# Altium footprint library SAMTEC THD.PcbLib: 161 footprints (part 6 of 12) (continued)
## SAMTEC_SSW-105-01-G-D [mm] "10 Contacts - Pitch 2.54mm - Double Row Through Mount Straight Socket (Lead Length 2.64mm)"
height 8.51
pads (10):
  round 1.7 hole 1: 1(-5.08,1.27) 2(-5.08,-1.27) 3(-2.54,1.27) 4(-2.54,-1.27) 5(0,1.27) 6(0,-1.27) 7(2.54,1.27) 8(2.54,-1.27) 9(5.08,1.27) 10(5.08,-1.27)
Top Overlay:
  circle w0.3: c-5.115,3.135 r0.15
  lines w0.2: -6.604,-2.477 6.604,-2.477 6.604,2.477 -6.604,2.477 -6.604,-2.477
  text "1" at -7.427,0.772 h1.2
  text "10" at 7.15,-1.85 h1.2
Mechanical 8:
  lines w0.1: -5.58,-1.27 -5.08,-1.27 ; -5.58,1.27 -5.08,1.27 ; -5.08,-1.77 -5.08,-1.27 ; -5.08,-0.77 -5.08,-1.27 ; -5.08,0.77 -5.08,1.27 ; -5.08,1.77 -5.08,1.27 ; -4.58,-1.27 -5.08,-1.27 ; -4.58,1.27 -5.08,1.27 ; -3.04,-1.27 -2.54,-1.27 ; -3.04,1.27 -2.54,1.27 ; -2.54,-1.77 -2.54,-1.27 ; -2.54,-0.77 -2.54,-1.27 ; -2.54,0.77 -2.54,1.27 ; -2.54,1.77 -2.54,1.27 ; -2.04,-1.27 -2.54,-1.27 ; -2.04,1.27 -2.54,1.27 ; -0.5,-1.27 0,-1.27 ; -0.5,0 0,0 ; -0.5,1.27 0,1.27 ; 0,-1.77 0,-1.27 ; 0,-0.77 0,-1.27 ; 0,-0.5 0,0 ; 0,0.5 0,0 ; 0,0.77 0,1.27 ; 0,1.77 0,1.27 ; 0.5,-1.27 0,-1.27 ; 0.5,0 0,0 ; 0.5,1.27 0,1.27 ; 2.04,-1.27 2.54,-1.27 ; 2.04,1.27 2.54,1.27 ; 2.54,-1.77 2.54,-1.27 ; 2.54,-0.77 2.54,-1.27 ; 2.54,0.77 2.54,1.27 ; 2.54,1.77 2.54,1.27 ; 3.04,-1.27 2.54,-1.27 ; 3.04,1.27 2.54,1.27 ; 4.58,-1.27 5.08,-1.27 ; 4.58,1.27 5.08,1.27 ; 5.08,-1.77 5.08,-1.27 ; 5.08,-0.77 5.08,-1.27 ; 5.08,0.77 5.08,1.27 ; 5.08,1.77 5.08,1.27 ; 5.58,-1.27 5.08,-1.27 ; 5.58,1.27 5.08,1.27
Mechanical 14:
  circle w0.3: c-5.115,3.135 r0.15
  lines w0.1: -6.604,-2.477 6.604,-2.477 6.604,2.35 6.731,2.477 -6.604,2.477 -6.604,-2.477 ; -5.906,-2.095 -5.906,-0.445 -4.255,-0.445 -4.255,-2.095 -5.906,-2.095 ; -5.906,0.445 -5.906,2.095 -4.255,2.095 -4.255,0.445 -5.906,0.445 ; -5.474,-1.664 -5.474,-0.876 -4.686,-0.876 -4.686,-1.664 -5.474,-1.664 ; -5.474,0.876 -5.474,1.664 -4.686,1.664 -4.686,0.876 -5.474,0.876 ; -3.366,-2.095 -3.366,-0.445 -1.715,-0.445 -1.715,-2.095 -3.366,-2.095 ; -3.366,0.445 -3.366,2.095 -1.715,2.095 -1.715,0.445 -3.366,0.445 ; -2.934,-1.664 -2.934,-0.876 -2.146,-0.876 -2.146,-1.664 -2.934,-1.664 ; -2.934,0.876 -2.934,1.664 -2.146,1.664 -2.146,0.876 -2.934,0.876 ; -0.826,-2.095 -0.826,-0.445 0.825,-0.445 0.825,-2.095 -0.826,-2.095 ; -0.826,0.445 -0.826,2.095 0.825,2.095 0.825,0.445 -0.826,0.445 ; -0.394,-1.664 -0.394,-0.876 0.394,-0.876 0.394,-1.664 -0.394,-1.664 ; -0.394,0.876 -0.394,1.664 0.394,1.664 0.394,0.876 -0.394,0.876 ; 1.714,-2.095 1.714,-0.445 3.365,-0.445 3.365,-2.095 1.714,-2.095 ; 1.714,0.445 1.714,2.095 3.365,2.095 3.365,0.445 1.714,0.445 ; 2.146,-1.664 2.146,-0.876 2.934,-0.876 2.934,-1.664 2.146,-1.664 ; 2.146,0.876 2.146,1.664 2.934,1.664 2.934,0.876 2.146,0.876 ; 4.255,-2.095 4.255,-0.445 5.905,-0.445 5.905,-2.095 4.255,-2.095 ; 4.255,0.445 4.255,2.095 5.905,2.095 5.905,0.445 4.255,0.445 ; 4.686,-1.664 4.686,-0.876 5.474,-0.876 5.474,-1.664 4.686,-1.664 ; 4.686,0.876 4.686,1.664 5.474,1.664 5.474,0.876 4.686,0.876
  text "1" at -7.427,0.772 h1.2
  text "10" at 7.15,-1.85 h1.2
3D body "SAMTEC_SSW-105-01-G-D.stp": height 8.51, standoff -2.64, extent -6.604,-2.476 6.604,2.477

## SAMTEC_SSW-106-02-L-D-RA [mm] "12 Contacts, Pitch 2.54mm - Dual Row, Through Mount Right Angle Socket"
height 4.95
pads (12):
  rect 1.8x1.8 hole 1.1: 1(6.35,-1.27)
  round 1.8 hole 1.1: 2(6.35,1.27) 3(3.81,-1.27) 4(3.81,1.27) 5(1.27,-1.27) 6(1.27,1.27) 7(-1.27,-1.27) 8(-1.27,1.27) 9(-3.81,-1.27) 10(-3.81,1.27) 11(-6.35,-1.27) 12(-6.35,1.27)
Top Overlay:
  circle w0.3: c7.979,-1.3 r0.15
  lines w0.2: -6.744,2.67 -6.744,3.302 ; -5.956,2.67 -5.956,3.302 ; -4.204,2.67 -4.204,3.302 ; -3.416,2.67 -3.416,3.302 ; -1.664,2.67 -1.664,3.302 ; -0.876,2.67 -0.876,3.302 ; 0.876,2.67 0.876,3.302 ; 1.664,2.67 1.664,3.302 ; 3.416,2.67 3.416,3.302 ; 4.204,2.67 4.204,3.302 ; 5.956,2.67 5.956,3.302 ; 6.744,2.67 6.744,3.302 ; -7.874,2.794 -7.874,11.303 7.874,11.303 7.874,2.794 7.366,2.794 7.366,3.302 5.334,3.302 5.334,2.794 4.826,2.794 4.826,3.302 2.794,3.302 2.794,2.794 2.286,2.794 2.286,3.302 0.254,3.302 0.254,2.794 -0.254,2.794 -0.254,3.302 -2.286,3.302 -2.286,2.794 -2.794,2.794 -2.794,3.302 -4.826,3.302 -4.826,2.794 -5.334,2.794 -5.334,3.302 -7.366,3.302 -7.366,2.794 -7.874,2.794
Mechanical 8:
  circle w0.1: c-6.35,1.27 r0.6
  circle w0.1: c-6.35,1.27 r0.95
  lines w0.1: -6.85,-1.27 -6.35,-1.27 ; -6.85,1.27 -6.35,1.27 ; -6.35,-1.77 -6.35,-1.27 ; -6.35,-0.77 -6.35,-1.27 ; -6.35,0.77 -6.35,1.27 ; -6.35,1.77 -6.35,1.27 ; -5.85,-1.27 -6.35,-1.27 ; -5.85,1.27 -6.35,1.27 ; -4.31,-1.27 -3.81,-1.27 ; -4.31,1.27 -3.81,1.27 ; -3.81,-1.77 -3.81,-1.27 ; -3.81,-0.77 -3.81,-1.27 ; -3.81,0.77 -3.81,1.27 ; -3.81,1.77 -3.81,1.27 ; -3.31,-1.27 -3.81,-1.27 ; -3.31,1.27 -3.81,1.27 ; -1.77,-1.27 -1.27,-1.27 ; -1.77,1.27 -1.27,1.27 ; -1.27,-1.77 -1.27,-1.27 ; -1.27,-0.77 -1.27,-1.27 ; -1.27,0.77 -1.27,1.27 ; -1.27,1.77 -1.27,1.27 ; -0.77,-1.27 -1.27,-1.27 ; -0.77,1.27 -1.27,1.27 ; -0.5,0 0,0 ; 0,-0.5 0,0 ; 0,0.5 0,0 ; 0.5,0 0,0 ; 0.77,-1.27 1.27,-1.27 ; 0.77,1.27 1.27,1.27 ; 1.27,-1.77 1.27,-1.27 ; 1.27,-0.77 1.27,-1.27 ; 1.27,0.77 1.27,1.27 ; 1.27,1.77 1.27,1.27 ; 1.77,-1.27 1.27,-1.27 ; 1.77,1.27 1.27,1.27 ; 3.31,-1.27 3.81,-1.27 ; 3.31,1.27 3.81,1.27 ; 3.81,-1.77 3.81,-1.27 ; 3.81,-0.77 3.81,-1.27 ; 3.81,0.77 3.81,1.27 ; 3.81,1.77 3.81,1.27 ; 4.31,-1.27 3.81,-1.27 ; 4.31,1.27 3.81,1.27 ; 5.85,-1.27 6.35,-1.27 ; 5.85,1.27 6.35,1.27 ; 6.35,-1.77 6.35,-1.27 ; 6.35,-0.77 6.35,-1.27 ; 6.35,0.77 6.35,1.27 ; 6.35,1.77 6.35,1.27 ; 6.85,-1.27 6.35,-1.27 ; 6.85,1.27 6.35,1.27
Mechanical 14:
  circle w0.3: c7.979,-1.3 r0.15
  lines w0.1: -6.744,3.302 -6.744,-1.473 -5.956,-1.473 -5.956,3.302 ; -4.204,3.302 -4.204,-1.473 -3.416,-1.473 -3.416,3.302 ; -1.664,3.302 -1.664,-1.473 -0.876,-1.473 -0.876,3.302 ; 0.876,3.302 0.876,-1.473 1.664,-1.473 1.664,3.302 ; 3.416,3.302 3.416,-1.473 4.204,-1.473 4.204,3.302 ; 5.956,3.302 5.956,-1.473 6.744,-1.473 6.744,3.302 ; -7.874,2.794 -7.874,11.303 7.874,11.303 7.874,2.794 7.366,2.794 7.366,3.302 5.334,3.302 5.334,2.794 4.826,2.794 4.826,3.302 2.794,3.302 2.794,2.794 2.286,2.794 2.286,3.302 0.254,3.302 0.254,2.794 -0.254,2.794 -0.254,3.302 -2.286,3.302 -2.286,2.794 -2.794,2.794 -2.794,3.302 -4.826,3.302 -4.826,2.794 -5.334,2.794 -5.334,3.302 -7.366,3.302 -7.366,2.794 -7.874,2.794
3D body "SAMTEC_SSW-106-02-L-D-RA.stp": height 4.95, standoff -2.53, extent -7.874,-1.473 7.874,11.303

## SAMTEC_SSW-106-22-G-D [mm] "12 Contacts, Pitch 2.54mm - Top Entry, Dual Row, Through Mount Straigh Socket"
height 8.51
pads (12):
  rect 1.8x1.8 hole 1.1: 1(-6.35,1.27)
  round 1.8 hole 1.1: 2(-6.35,-1.27) 3(-3.81,1.27) 4(-3.81,-1.27) 5(-1.27,1.27) 6(-1.27,-1.27) 7(1.27,1.27) 8(1.27,-1.27) 9(3.81,1.27) 10(3.81,-1.27) 11(6.35,1.27) 12(6.35,-1.27)
Top Overlay:
  circle w0.3: c-6.385,3.135 r0.15
  lines w0.2: -7.874,-2.476 -7.874,2.476 7.874,2.476 7.874,-2.476 -7.874,-2.476
  text "12" at 8.45,-1.87 h1.2
  text "1" at -8.75,0.67 h1.2
Mechanical 8:
  lines w0.1: -0.5,0 0,0 ; 0,-0.5 0,0 ; 0,0.5 0,0 ; 0.5,0 0,0
Mechanical 14:
  circle w0.3: c-6.385,3.135 r0.15
  lines w0.1: -7.874,-2.476 7.874,-2.476 7.874,2.476 -7.874,2.476 -7.874,-2.476 ; -6.744,-1.664 -6.744,-0.876 -5.956,-0.876 -5.956,-1.664 -6.744,-1.664 ; -6.744,0.876 -6.744,1.664 -5.956,1.664 -5.956,0.876 -6.744,0.876 ; -4.204,-1.664 -3.416,-1.664 -3.416,-0.876 -4.204,-0.876 -4.204,-1.664 ; -4.204,0.876 -4.204,1.664 -3.416,1.664 -3.416,0.876 -4.204,0.876 ; -1.664,-1.664 -0.876,-1.664 -0.876,-0.876 -1.664,-0.876 -1.664,-1.664 ; -1.664,0.876 -0.876,0.876 -0.876,1.664 -1.664,1.664 -1.664,0.876 ; 0.876,-1.664 1.664,-1.664 1.664,-0.876 0.876,-0.876 0.876,-1.664 ; 0.876,0.876 1.664,0.876 1.664,1.664 0.876,1.664 0.876,0.876 ; 3.416,-1.664 4.204,-1.664 4.204,-0.876 3.416,-0.876 3.416,-1.664 ; 3.416,0.876 4.204,0.876 4.204,1.664 3.416,1.664 3.416,0.876 ; 5.956,-1.664 6.744,-1.664 6.744,-0.876 5.956,-0.876 5.956,-1.664 ; 5.956,0.876 6.744,0.876 6.744,1.664 5.956,1.664 5.956,0.876
  text "12" at 8.45,-1.87 h1.2
  text "1" at -8.75,0.67 h1.2
3D body "SAMTEC_SSW-106-22-G-D.stp": height 8.51, standoff -4.93, extent -7.874,-2.476 7.874,2.477

## SAMTEC_SSW-107-01-G-D [mm] "14 Contacts - Pitch 2.54mm - Double Row Through Mount Straight Socket (Lead Length 2.64mm)"
height 8.51
pads (14):
  round 1.7 hole 1: 1(-7.62,1.27) 2(-7.62,-1.27) 3(-5.08,1.27) 4(-5.08,-1.27) 5(-2.54,1.27) 6(-2.54,-1.27) 7(0,1.27) 8(0,-1.27) 9(2.54,1.27) 10(2.54,-1.27) 11(5.08,1.27) 12(5.08,-1.27) 13(7.62,1.27) 14(7.62,-1.27)
Top Overlay:
  circle w0.3: c-7.655,3.135 r0.15
  lines w0.2: -9.144,-2.477 9.144,-2.477 9.144,2.477 -9.144,2.477 -9.144,-2.477
  text "1" at -9.967,0.772 h1.2
  text "14" at 9.69,-1.85 h1.2
Mechanical 8:
  lines w0.1: -8.12,-1.27 -7.62,-1.27 ; -8.12,1.27 -7.62,1.27 ; -7.62,-1.77 -7.62,-1.27 ; -7.62,-0.77 -7.62,-1.27 ; -7.62,0.77 -7.62,1.27 ; -7.62,1.77 -7.62,1.27 ; -7.12,-1.27 -7.62,-1.27 ; -7.12,1.27 -7.62,1.27 ; -5.58,-1.27 -5.08,-1.27 ; -5.58,1.27 -5.08,1.27 ; -5.08,-1.77 -5.08,-1.27 ; -5.08,-0.77 -5.08,-1.27 ; -5.08,0.77 -5.08,1.27 ; -5.08,1.77 -5.08,1.27 ; -4.58,-1.27 -5.08,-1.27 ; -4.58,1.27 -5.08,1.27 ; -3.04,-1.27 -2.54,-1.27 ; -3.04,1.27 -2.54,1.27 ; -2.54,-1.77 -2.54,-1.27 ; -2.54,-0.77 -2.54,-1.27 ; -2.54,0.77 -2.54,1.27 ; -2.54,1.77 -2.54,1.27 ; -2.04,-1.27 -2.54,-1.27 ; -2.04,1.27 -2.54,1.27 ; -0.5,-1.27 0,-1.27 ; -0.5,0 0,0 ; -0.5,1.27 0,1.27 ; 0,-1.77 0,-1.27 ; 0,-0.77 0,-1.27 ; 0,-0.5 0,0 ; 0,0.5 0,0 ; 0,0.77 0,1.27 ; 0,1.77 0,1.27 ; 0.5,-1.27 0,-1.27 ; 0.5,0 0,0 ; 0.5,1.27 0,1.27 ; 2.04,-1.27 2.54,-1.27 ; 2.04,1.27 2.54,1.27 ; 2.54,-1.77 2.54,-1.27 ; 2.54,-0.77 2.54,-1.27 ; 2.54,0.77 2.54,1.27 ; 2.54,1.77 2.54,1.27 ; 3.04,-1.27 2.54,-1.27 ; 3.04,1.27 2.54,1.27 ; 4.58,-1.27 5.08,-1.27 ; 4.58,1.27 5.08,1.27 ; 5.08,-1.77 5.08,-1.27 ; 5.08,-0.77 5.08,-1.27 ; 5.08,0.77 5.08,1.27 ; 5.08,1.77 5.08,1.27 ; 5.58,-1.27 5.08,-1.27 ; 5.58,1.27 5.08,1.27 ; 7.12,-1.27 7.62,-1.27 ; 7.12,1.27 7.62,1.27 ; 7.62,-1.77 7.62,-1.27 ; 7.62,-0.77 7.62,-1.27 ; 7.62,0.77 7.62,1.27 ; 7.62,1.77 7.62,1.27 ; 8.12,-1.27 7.62,-1.27 ; 8.12,1.27 7.62,1.27
Mechanical 14:
  circle w0.3: c-7.655,3.135 r0.15
  lines w0.1: -9.144,-2.477 -9.144,2.477 9.144,2.477 9.144,-2.477 -9.144,-2.477 ; -8.446,-2.095 -8.446,-0.445 -6.795,-0.445 -6.795,-2.095 -8.446,-2.095 ; -8.446,0.445 -8.446,2.095 -6.795,2.095 -6.795,0.445 -8.446,0.445 ; -8.014,-1.664 -8.014,-0.876 -7.226,-0.876 -7.226,-1.664 -8.014,-1.664 ; -8.014,0.876 -8.014,1.664 -7.226,1.664 -7.226,0.876 -8.014,0.876 ; -5.906,-2.095 -5.906,-0.445 -4.255,-0.445 -4.255,-2.095 -5.906,-2.095 ; -5.906,0.445 -5.906,2.095 -4.255,2.095 -4.255,0.445 -5.906,0.445 ; -5.474,-1.664 -5.474,-0.876 -4.686,-0.876 -4.686,-1.664 -5.474,-1.664 ; -5.474,0.876 -5.474,1.664 -4.686,1.664 -4.686,0.876 -5.474,0.876 ; -3.366,-2.095 -3.366,-0.445 -1.715,-0.445 -1.715,-2.095 -3.366,-2.095 ; -3.366,0.445 -3.366,2.095 -1.715,2.095 -1.715,0.445 -3.366,0.445 ; -2.934,-1.664 -2.934,-0.876 -2.146,-0.876 -2.146,-1.664 -2.934,-1.664 ; -2.934,0.876 -2.934,1.664 -2.146,1.664 -2.146,0.876 -2.934,0.876 ; -0.826,-2.095 -0.826,-0.445 0.826,-0.445 0.826,-2.095 -0.826,-2.095 ; -0.826,0.445 -0.826,2.095 0.826,2.095 0.826,0.445 -0.826,0.445 ; -0.394,-1.664 -0.394,-0.876 0.394,-0.876 0.394,-1.664 -0.394,-1.664 ; -0.394,0.876 -0.394,1.664 0.394,1.664 0.394,0.876 -0.394,0.876 ; 1.714,-2.095 1.714,-0.445 3.365,-0.445 3.365,-2.095 1.714,-2.095 ; 1.714,0.445 1.714,2.095 3.365,2.095 3.365,0.445 1.714,0.445 ; 2.146,-1.664 2.146,-0.876 2.934,-0.876 2.934,-1.664 2.146,-1.664 ; 2.146,0.876 2.146,1.664 2.934,1.664 2.934,0.876 2.146,0.876 ; 4.255,-2.095 4.255,-0.445 5.906,-0.445 5.906,-2.095 4.255,-2.095 ; 4.255,0.445 4.255,2.095 5.906,2.095 5.906,0.445 4.255,0.445 ; 4.686,-1.664 4.686,-0.876 5.474,-0.876 5.474,-1.664 4.686,-1.664 ; 4.686,0.876 4.686,1.664 5.474,1.664 5.474,0.876 4.686,0.876 ; 6.795,-2.095 6.795,-0.445 8.446,-0.445 8.446,-2.095 6.795,-2.095 ; 6.795,0.445 6.795,2.095 8.446,2.095 8.446,0.445 6.795,0.445 ; 7.226,-1.664 7.226,-0.876 8.014,-0.876 8.014,-1.664 7.226,-1.664 ; 7.226,0.876 7.226,1.664 8.014,1.664 8.014,0.876 7.226,0.876
  text "1" at -9.967,0.772 h1.2
  text "14" at 9.69,-1.85 h1.2
3D body "SAMTEC_SSW-107-01-G-D.stp": height 8.51, standoff -2.64, extent -9.144,-2.476 9.144,2.477

## SAMTEC_SSW-108-02-G-D [mm] "16 Contacts, Pitch 2.54mm - Top Entry, Dual Row, Through Mount Straigh Socket"
height 8.5
pads (16):
  round 1.7 hole 1: 1(-8.89,1.27) 2(-8.89,-1.27) 3(-6.35,1.27) 4(-6.35,-1.27) 5(-3.81,1.27) 6(-3.81,-1.27) 7(-1.27,1.27) 8(-1.27,-1.27) 9(1.27,1.27) 10(1.27,-1.27) 11(3.81,1.27) 12(3.81,-1.27) 13(6.35,1.27) 14(6.35,-1.27) 15(8.89,1.27) 16(8.89,-1.27)
Top Overlay:
  circle w0.3: c-8.925,3.135 r0.15
  lines w0.2: -10.414,-2.477 10.414,-2.477 10.414,2.477 -10.414,2.477 -10.414,-2.477
  text "16" at 10.96,-1.85 h1.2
  text "1" at -11.237,0.772 h1.2
Mechanical 8:
  lines w0.1: -9.39,-1.27 -8.89,-1.27 ; -9.39,1.27 -8.89,1.27 ; -8.89,-1.77 -8.89,-1.27 ; -8.89,-0.77 -8.89,-1.27 ; -8.89,0.77 -8.89,1.27 ; -8.89,1.77 -8.89,1.27 ; -8.39,-1.27 -8.89,-1.27 ; -8.39,1.27 -8.89,1.27 ; -6.85,-1.27 -6.35,-1.27 ; -6.85,1.27 -6.35,1.27 ; -6.35,-1.77 -6.35,-1.27 ; -6.35,-0.77 -6.35,-1.27 ; -6.35,0.77 -6.35,1.27 ; -6.35,1.77 -6.35,1.27 ; -5.85,-1.27 -6.35,-1.27 ; -5.85,1.27 -6.35,1.27 ; -4.31,-1.27 -3.81,-1.27 ; -4.31,1.27 -3.81,1.27 ; -3.81,-1.77 -3.81,-1.27 ; -3.81,-0.77 -3.81,-1.27 ; -3.81,0.77 -3.81,1.27 ; -3.81,1.77 -3.81,1.27 ; -3.31,-1.27 -3.81,-1.27 ; -3.31,1.27 -3.81,1.27 ; -1.77,-1.27 -1.27,-1.27 ; -1.77,1.27 -1.27,1.27 ; -1.27,-1.77 -1.27,-1.27 ; -1.27,-0.77 -1.27,-1.27 ; -1.27,0.77 -1.27,1.27 ; -1.27,1.77 -1.27,1.27 ; -0.77,-1.27 -1.27,-1.27 ; -0.77,1.27 -1.27,1.27 ; -0.5,0 0,0 ; 0,-0.5 0,0 ; 0,0.5 0,0 ; 0.5,0 0,0 ; 0.77,-1.27 1.27,-1.27 ; 0.77,1.27 1.27,1.27 ; 1.27,-1.77 1.27,-1.27 ; 1.27,-0.77 1.27,-1.27 ; 1.27,0.77 1.27,1.27 ; 1.27,1.77 1.27,1.27 ; 1.77,-1.27 1.27,-1.27 ; 1.77,1.27 1.27,1.27 ; 3.31,-1.27 3.81,-1.27 ; 3.31,1.27 3.81,1.27 ; 3.81,-1.77 3.81,-1.27 ; 3.81,-0.77 3.81,-1.27 ; 3.81,0.77 3.81,1.27 ; 3.81,1.77 3.81,1.27 ; 4.31,-1.27 3.81,-1.27 ; 4.31,1.27 3.81,1.27 ; 5.85,-1.27 6.35,-1.27 ; 5.85,1.27 6.35,1.27 ; 6.35,-1.77 6.35,-1.27 ; 6.35,-0.77 6.35,-1.27 ; 6.35,0.77 6.35,1.27 ; 6.35,1.77 6.35,1.27 ; 6.85,-1.27 6.35,-1.27 ; 6.85,1.27 6.35,1.27 ; 8.39,-1.27 8.89,-1.27 ; 8.39,1.27 8.89,1.27 ; 8.89,-1.77 8.89,-1.27 ; 8.89,-0.77 8.89,-1.27 ; 8.89,0.77 8.89,1.27 ; 8.89,1.77 8.89,1.27 ; 9.39,-1.27 8.89,-1.27 ; 9.39,1.27 8.89,1.27
Mechanical 14:
  drawing of 197 lines, arcs and shapes, not listed
  text "16" at 10.96,-1.85 h1.2
  text "1" at -11.237,0.772 h1.2
3D body "SAMTEC_SSW-108-02-G-D.stp": height 8.51, standoff -4.93, extent -10.414,-2.476 10.414,2.477

## SAMTEC_SSW-108-02-L-D [mm] "16 Contacts, Pitch 2.54mm - Top Entry, Dual Row, Through Mount Straigh Socket"
height 8.5
pads (16):
  round 1.7 hole 1: 1(-8.89,1.27) 2(-8.89,-1.27) 3(-6.35,1.27) 4(-6.35,-1.27) 5(-3.81,1.27) 6(-3.81,-1.27) 7(-1.27,1.27) 8(-1.27,-1.27) 9(1.27,1.27) 10(1.27,-1.27) 11(3.81,1.27) 12(3.81,-1.27) 13(6.35,1.27) 14(6.35,-1.27) 15(8.89,1.27) 16(8.89,-1.27)
Top Overlay:
  circle w0.3: c-8.925,3.135 r0.15
  lines w0.2: -10.414,-2.477 -10.414,2.477 10.414,2.477 10.414,-2.477 -10.414,-2.477
  text "1" at -11.237,0.772 h1.2
  text "16" at 10.96,-1.85 h1.2
Mechanical 8:
  lines w0.1: -9.39,-1.27 -8.89,-1.27 ; -9.39,1.27 -8.89,1.27 ; -8.89,-1.77 -8.89,-1.27 ; -8.89,-0.77 -8.89,-1.27 ; -8.89,0.77 -8.89,1.27 ; -8.89,1.77 -8.89,1.27 ; -8.39,-1.27 -8.89,-1.27 ; -8.39,1.27 -8.89,1.27 ; -6.85,-1.27 -6.35,-1.27 ; -6.85,1.27 -6.35,1.27 ; -6.35,-1.77 -6.35,-1.27 ; -6.35,-0.77 -6.35,-1.27 ; -6.35,0.77 -6.35,1.27 ; -6.35,1.77 -6.35,1.27 ; -5.85,-1.27 -6.35,-1.27 ; -5.85,1.27 -6.35,1.27 ; -4.31,-1.27 -3.81,-1.27 ; -4.31,1.27 -3.81,1.27 ; -3.81,-1.77 -3.81,-1.27 ; -3.81,-0.77 -3.81,-1.27 ; -3.81,0.77 -3.81,1.27 ; -3.81,1.77 -3.81,1.27 ; -3.31,-1.27 -3.81,-1.27 ; -3.31,1.27 -3.81,1.27 ; -1.77,-1.27 -1.27,-1.27 ; -1.77,1.27 -1.27,1.27 ; -1.27,-1.77 -1.27,-1.27 ; -1.27,-0.77 -1.27,-1.27 ; -1.27,0.77 -1.27,1.27 ; -1.27,1.77 -1.27,1.27 ; -0.77,-1.27 -1.27,-1.27 ; -0.77,1.27 -1.27,1.27 ; -0.5,0 0,0 ; 0,-0.5 0,0 ; 0,0.5 0,0 ; 0.5,0 0,0 ; 0.77,-1.27 1.27,-1.27 ; 0.77,1.27 1.27,1.27 ; 1.27,-1.77 1.27,-1.27 ; 1.27,-0.77 1.27,-1.27 ; 1.27,0.77 1.27,1.27 ; 1.27,1.77 1.27,1.27 ; 1.77,-1.27 1.27,-1.27 ; 1.77,1.27 1.27,1.27 ; 3.31,-1.27 3.81,-1.27 ; 3.31,1.27 3.81,1.27 ; 3.81,-1.77 3.81,-1.27 ; 3.81,-0.77 3.81,-1.27 ; 3.81,0.77 3.81,1.27 ; 3.81,1.77 3.81,1.27 ; 4.31,-1.27 3.81,-1.27 ; 4.31,1.27 3.81,1.27 ; 5.85,-1.27 6.35,-1.27 ; 5.85,1.27 6.35,1.27 ; 6.35,-1.77 6.35,-1.27 ; 6.35,-0.77 6.35,-1.27 ; 6.35,0.77 6.35,1.27 ; 6.35,1.77 6.35,1.27 ; 6.85,-1.27 6.35,-1.27 ; 6.85,1.27 6.35,1.27 ; 8.39,-1.27 8.89,-1.27 ; 8.39,1.27 8.89,1.27 ; 8.89,-1.77 8.89,-1.27 ; 8.89,-0.77 8.89,-1.27 ; 8.89,0.77 8.89,1.27 ; 8.89,1.77 8.89,1.27 ; 9.39,-1.27 8.89,-1.27 ; 9.39,1.27 8.89,1.27
Mechanical 14:
  drawing of 197 lines, arcs and shapes, not listed
  text "1" at -11.237,0.772 h1.2
  text "16" at 10.96,-1.85 h1.2
3D body "SAMTEC_SSW-108-02-L-D.stp": height 8.51, standoff -4.93, extent -10.414,-2.476 10.414,2.477

## SAMTEC_SSW-109-01-G-D [mm] "18 Contacts - Pitch 2.54mm - Double Row Through Mount Straight Socket (Lead Length 2.64mm)"
height 8.51
pads (18):
  round 1.7 hole 1: 1(-10.16,1.27) 2(-10.16,-1.27) 3(-7.62,1.27) 4(-7.62,-1.27) 5(-5.08,1.27) 6(-5.08,-1.27) 7(-2.54,1.27) 8(-2.54,-1.27) 9(0,1.27) 10(0,-1.27) 11(2.54,1.27) 12(2.54,-1.27) 13(5.08,1.27) 14(5.08,-1.27) 15(7.62,1.27) 16(7.62,-1.27) 17(10.16,1.27) 18(10.16,-1.27)
Top Overlay:
  circle w0.3: c-10.195,3.135 r0.15
  lines w0.2: -11.684,-2.477 11.684,-2.477 11.684,2.477 -11.684,2.476 -11.684,-2.477
  text "1" at -12.507,0.772 h1.2
  text "18" at 12.23,-1.85 h1.2
Mechanical 8:
  lines w0.1: -10.66,-1.27 -10.16,-1.27 ; -10.66,1.27 -10.16,1.27 ; -10.16,-1.77 -10.16,-1.27 ; -10.16,-0.77 -10.16,-1.27 ; -10.16,0.77 -10.16,1.27 ; -10.16,1.77 -10.16,1.27 ; -9.66,-1.27 -10.16,-1.27 ; -9.66,1.27 -10.16,1.27 ; -8.12,-1.27 -7.62,-1.27 ; -8.12,1.27 -7.62,1.27 ; -7.62,-1.77 -7.62,-1.27 ; -7.62,-0.77 -7.62,-1.27 ; -7.62,0.77 -7.62,1.27 ; -7.62,1.77 -7.62,1.27 ; -7.12,-1.27 -7.62,-1.27 ; -7.12,1.27 -7.62,1.27 ; -5.58,-1.27 -5.08,-1.27 ; -5.58,1.27 -5.08,1.27 ; -5.08,-1.77 -5.08,-1.27 ; -5.08,-0.77 -5.08,-1.27 ; -5.08,0.77 -5.08,1.27 ; -5.08,1.77 -5.08,1.27 ; -4.58,-1.27 -5.08,-1.27 ; -4.58,1.27 -5.08,1.27 ; -3.04,-1.27 -2.54,-1.27 ; -3.04,1.27 -2.54,1.27 ; -2.54,-1.77 -2.54,-1.27 ; -2.54,-0.77 -2.54,-1.27 ; -2.54,0.77 -2.54,1.27 ; -2.54,1.77 -2.54,1.27 ; -2.04,-1.27 -2.54,-1.27 ; -2.04,1.27 -2.54,1.27 ; -0.5,-1.27 0,-1.27 ; -0.5,0 0,0 ; -0.5,1.27 0,1.27 ; 0,-1.77 0,-1.27 ; 0,-0.77 0,-1.27 ; 0,-0.5 0,0 ; 0,0.5 0,0 ; 0,0.77 0,1.27 ; 0,1.77 0,1.27 ; 0.5,-1.27 0,-1.27 ; 0.5,0 0,0 ; 0.5,1.27 0,1.27 ; 2.04,-1.27 2.54,-1.27 ; 2.04,1.27 2.54,1.27 ; 2.54,-1.77 2.54,-1.27 ; 2.54,-0.77 2.54,-1.27 ; 2.54,0.77 2.54,1.27 ; 2.54,1.77 2.54,1.27 ; 3.04,-1.27 2.54,-1.27 ; 3.04,1.27 2.54,1.27 ; 4.58,-1.27 5.08,-1.27 ; 4.58,1.27 5.08,1.27 ; 5.08,-1.77 5.08,-1.27 ; 5.08,-0.77 5.08,-1.27 ; 5.08,0.77 5.08,1.27 ; 5.08,1.77 5.08,1.27 ; 5.58,-1.27 5.08,-1.27 ; 5.58,1.27 5.08,1.27 ; 7.12,-1.27 7.62,-1.27 ; 7.12,1.27 7.62,1.27 ; 7.62,-1.77 7.62,-1.27 ; 7.62,-0.77 7.62,-1.27 ; 7.62,0.77 7.62,1.27 ; 7.62,1.77 7.62,1.27 ; 8.12,-1.27 7.62,-1.27 ; 8.12,1.27 7.62,1.27 ; 9.66,-1.27 10.16,-1.27 ; 9.66,1.27 10.16,1.27 ; 10.16,-1.77 10.16,-1.27 ; 10.16,-0.77 10.16,-1.27 ; 10.16,0.77 10.16,1.27 ; 10.16,1.77 10.16,1.27 ; 10.66,-1.27 10.16,-1.27 ; 10.66,1.27 10.16,1.27
Mechanical 14:
  circle w0.3: c-10.195,3.135 r0.15
  lines w0.1: -11.684,-2.477 -11.684,2.477 11.684,2.477 11.684,-2.477 -11.684,-2.477 ; -10.986,-2.095 -10.986,-0.445 -9.335,-0.445 -9.335,-2.095 -10.986,-2.095 ; -10.986,0.445 -10.986,2.095 -9.335,2.095 -9.335,0.445 -10.986,0.445 ; -10.554,-1.664 -10.554,-0.876 -9.766,-0.876 -9.766,-1.664 -10.554,-1.664 ; -10.554,0.876 -10.554,1.664 -9.766,1.664 -9.766,0.876 -10.554,0.876 ; -8.446,-2.095 -8.446,-0.445 -6.795,-0.445 -6.795,-2.095 -8.446,-2.095 ; -8.446,0.445 -8.446,2.095 -6.795,2.095 -6.795,0.445 -8.446,0.445 ; -8.014,-1.664 -8.014,-0.876 -7.226,-0.876 -7.226,-1.664 -8.014,-1.664 ; -8.014,0.876 -8.014,1.664 -7.226,1.664 -7.226,0.876 -8.014,0.876 ; -5.906,-2.095 -5.906,-0.445 -4.255,-0.445 -4.255,-2.095 -5.906,-2.095 ; -5.906,0.445 -5.906,2.095 -4.255,2.095 -4.255,0.445 -5.906,0.445 ; -5.474,-1.664 -5.474,-0.876 -4.686,-0.876 -4.686,-1.664 -5.474,-1.664 ; -5.474,0.876 -5.474,1.664 -4.686,1.664 -4.686,0.876 -5.474,0.876 ; -3.365,-2.095 -3.365,-0.445 -1.714,-0.445 -1.714,-2.095 -3.365,-2.095 ; -3.365,0.445 -3.365,2.095 -1.714,2.095 -1.714,0.445 -3.365,0.445 ; -2.934,-1.664 -2.934,-0.876 -2.146,-0.876 -2.146,-1.664 -2.934,-1.664 ; -2.934,0.876 -2.934,1.664 -2.146,1.664 -2.146,0.876 -2.934,0.876 ; -0.826,-2.095 -0.826,-0.445 0.826,-0.445 0.826,-2.095 -0.826,-2.095 ; -0.826,0.445 -0.826,2.095 0.826,2.095 0.826,0.445 -0.826,0.445 ; -0.394,-1.664 -0.394,-0.876 0.394,-0.876 0.394,-1.664 -0.394,-1.664 ; -0.394,0.876 -0.394,1.664 0.394,1.664 0.394,0.876 -0.394,0.876 ; 1.715,-2.095 1.715,-0.445 3.366,-0.445 3.366,-2.095 1.715,-2.095 ; 1.715,0.445 1.715,2.095 3.366,2.095 3.366,0.445 1.715,0.445 ; 2.146,-1.664 2.146,-0.876 2.934,-0.876 2.934,-1.664 2.146,-1.664 ; 2.146,0.876 2.146,1.664 2.934,1.664 2.934,0.876 2.146,0.876 ; 4.255,-2.095 4.255,-0.445 5.906,-0.445 5.906,-2.095 4.255,-2.095 ; 4.255,0.445 4.255,2.095 5.906,2.095 5.906,0.445 4.255,0.445 ; 4.686,-1.664 4.686,-0.876 5.474,-0.876 5.474,-1.664 4.686,-1.664 ; 4.686,0.876 4.686,1.664 5.474,1.664 5.474,0.876 4.686,0.876 ; 6.795,-2.095 8.446,-2.095 8.446,-0.445 6.795,-0.445 6.795,-2.095 ; 6.795,0.445 8.446,0.445 8.446,2.095 6.795,2.095 6.795,0.445 ; 7.226,-1.664 8.014,-1.664 8.014,-0.876 7.226,-0.876 7.226,-1.664 ; 7.226,0.876 8.014,0.876 8.014,1.664 7.226,1.664 7.226,0.876 ; 9.335,-2.095 10.986,-2.095 10.986,-0.445 9.335,-0.445 9.335,-2.095 ; 9.335,0.445 10.986,0.445 10.986,2.095 9.335,2.095 9.335,0.445 ; 9.766,-1.664 10.554,-1.664 10.554,-0.876 9.766,-0.876 9.766,-1.664 ; 9.766,0.876 10.554,0.876 10.554,1.664 9.766,1.664 9.766,0.876
  text "1" at -12.507,0.772 h1.2
  text "18" at 12.23,-1.85 h1.2
3D body "SAMTEC_SSW-109-01-G-D.stp": height 8.51, standoff -2.64, extent -11.684,-2.476 11.684,2.477

## SAMTEC_SSW-110-01-G-D [mm] "20 Contacts, Pitch 2.54mm, Double Row Through Mount Straight Socket (Lead Length 2.64mm)"
height 8.51
pads (20):
  round 1.7 hole 1: 1(-11.43,1.27) 2(-11.43,-1.27) 3(-8.89,1.27) 4(-8.89,-1.27) 5(-6.35,1.27) 6(-6.35,-1.27) 7(-3.81,1.27) 8(-3.81,-1.27) 9(-1.27,1.27) 10(-1.27,-1.27) 11(1.27,1.27) 12(1.27,-1.27) 13(3.81,1.27) 14(3.81,-1.27) 15(6.35,1.27) 16(6.35,-1.27) 17(8.89,1.27) 18(8.89,-1.27) 19(11.43,1.27) 20(11.43,-1.27)
Top Overlay:
  circle w0.3: c-11.465,3.135 r0.15
  lines w0.2: -12.954,-2.476 12.954,-2.476 12.954,2.476 -12.954,2.476 -12.954,-2.476
  text "20" at 13.57,-1.87 h1.2
  text "19" at 13.57,0.67 h1.2
  text "1" at -13.777,0.772 h1.2
Mechanical 8:
  lines w0.1: -11.93,-1.27 -11.43,-1.27 ; -11.93,1.27 -11.43,1.27 ; -11.43,-1.77 -11.43,-1.27 ; -11.43,-0.77 -11.43,-1.27 ; -11.43,0.77 -11.43,1.27 ; -11.43,1.77 -11.43,1.27 ; -10.93,-1.27 -11.43,-1.27 ; -10.93,1.27 -11.43,1.27 ; -9.39,-1.27 -8.89,-1.27 ; -9.39,1.27 -8.89,1.27 ; -8.89,-1.77 -8.89,-1.27 ; -8.89,-0.77 -8.89,-1.27 ; -8.89,0.77 -8.89,1.27 ; -8.89,1.77 -8.89,1.27 ; -8.39,-1.27 -8.89,-1.27 ; -8.39,1.27 -8.89,1.27 ; -6.85,-1.27 -6.35,-1.27 ; -6.85,1.27 -6.35,1.27 ; -6.35,-1.77 -6.35,-1.27 ; -6.35,-0.77 -6.35,-1.27 ; -6.35,0.77 -6.35,1.27 ; -6.35,1.77 -6.35,1.27 ; -5.85,-1.27 -6.35,-1.27 ; -5.85,1.27 -6.35,1.27 ; -4.31,-1.27 -3.81,-1.27 ; -4.31,1.27 -3.81,1.27 ; -3.81,-1.77 -3.81,-1.27 ; -3.81,-0.77 -3.81,-1.27 ; -3.81,0.77 -3.81,1.27 ; -3.81,1.77 -3.81,1.27 ; -3.31,-1.27 -3.81,-1.27 ; -3.31,1.27 -3.81,1.27 ; -1.77,-1.27 -1.27,-1.27 ; -1.77,1.27 -1.27,1.27 ; -1.27,-1.77 -1.27,-1.27 ; -1.27,-0.77 -1.27,-1.27 ; -1.27,0.77 -1.27,1.27 ; -1.27,1.77 -1.27,1.27 ; -0.77,-1.27 -1.27,-1.27 ; -0.77,1.27 -1.27,1.27 ; -0.5,0 0,0 ; 0,-0.5 0,0 ; 0,0.5 0,0 ; 0.5,0 0,0 ; 0.77,-1.27 1.27,-1.27 ; 0.77,1.27 1.27,1.27 ; 1.27,-1.77 1.27,-1.27 ; 1.27,-0.77 1.27,-1.27 ; 1.27,0.77 1.27,1.27 ; 1.27,1.77 1.27,1.27 ; 1.77,-1.27 1.27,-1.27 ; 1.77,1.27 1.27,1.27 ; 3.31,-1.27 3.81,-1.27 ; 3.31,1.27 3.81,1.27 ; 3.81,-1.77 3.81,-1.27 ; 3.81,-0.77 3.81,-1.27 ; 3.81,0.77 3.81,1.27 ; 3.81,1.77 3.81,1.27 ; 4.31,-1.27 3.81,-1.27 ; 4.31,1.27 3.81,1.27 ; 5.85,-1.27 6.35,-1.27 ; 5.85,1.27 6.35,1.27 ; 6.35,-1.77 6.35,-1.27 ; 6.35,-0.77 6.35,-1.27 ; 6.35,0.77 6.35,1.27 ; 6.35,1.77 6.35,1.27 ; 6.85,-1.27 6.35,-1.27 ; 6.85,1.27 6.35,1.27 ; 8.39,-1.27 8.89,-1.27 ; 8.39,1.27 8.89,1.27 ; 8.89,-1.77 8.89,-1.27 ; 8.89,-0.77 8.89,-1.27 ; 8.89,0.77 8.89,1.27 ; 8.89,1.77 8.89,1.27 ; 9.39,-1.27 8.89,-1.27 ; 9.39,1.27 8.89,1.27 ; 10.93,-1.27 11.43,-1.27 ; 10.93,1.27 11.43,1.27 ; 11.43,-1.77 11.43,-1.27 ; 11.43,-0.77 11.43,-1.27 ; 11.43,0.77 11.43,1.27 ; 11.43,1.77 11.43,1.27 ; 11.93,-1.27 11.43,-1.27 ; 11.93,1.27 11.43,1.27
Mechanical 14:
  circle w0.3: c-11.465,3.135 r0.15
  lines w0.1: -12.954,-2.476 12.954,-2.476 12.954,2.476 -12.954,2.476 -12.954,-2.476 ; -11.824,-1.664 -11.036,-1.664 -11.036,-0.876 -11.824,-0.876 -11.824,-1.664 ; -11.824,0.876 -11.036,0.876 -11.036,1.664 -11.824,1.664 -11.824,0.876 ; -9.284,-1.664 -8.496,-1.664 -8.496,-0.876 -9.284,-0.876 -9.284,-1.664 ; -9.284,0.876 -8.496,0.876 -8.496,1.664 -9.284,1.664 -9.284,0.876 ; -6.744,-1.664 -5.956,-1.664 -5.956,-0.876 -6.744,-0.876 -6.744,-1.664 ; -6.744,0.876 -5.956,0.876 -5.956,1.664 -6.744,1.664 -6.744,0.876 ; -4.204,-1.664 -3.416,-1.664 -3.416,-0.876 -4.204,-0.876 -4.204,-1.664 ; -4.204,0.876 -3.416,0.876 -3.416,1.664 -4.204,1.664 -4.204,0.876 ; -1.664,-1.664 -0.876,-1.664 -0.876,-0.876 -1.664,-0.876 -1.664,-1.664 ; -1.664,0.876 -0.876,0.876 -0.876,1.664 -1.664,1.664 -1.664,0.876 ; 0.876,-1.664 1.664,-1.664 1.664,-0.876 0.876,-0.876 0.876,-1.664 ; 0.876,0.876 1.664,0.876 1.664,1.664 0.876,1.664 0.876,0.876 ; 3.416,-1.664 4.204,-1.664 4.204,-0.876 3.416,-0.876 3.416,-1.664 ; 3.416,0.876 4.204,0.876 4.204,1.664 3.416,1.664 3.416,0.876 ; 5.956,-1.664 6.744,-1.664 6.744,-0.876 5.956,-0.876 5.956,-1.664 ; 5.956,0.876 6.744,0.876 6.744,1.664 5.956,1.664 5.956,0.876 ; 8.496,-1.664 9.284,-1.664 9.284,-0.876 8.496,-0.876 8.496,-1.664 ; 8.496,0.876 9.284,0.876 9.284,1.664 8.496,1.664 8.496,0.876 ; 11.036,-1.664 11.824,-1.664 11.824,-0.876 11.036,-0.876 11.036,-1.664 ; 11.036,0.876 11.824,0.876 11.824,1.664 11.036,1.664 11.036,0.876
  text "1" at -13.777,0.772 h1.2
3D body "SAMTEC_SSW-110-01-G-D.stp": height 8.51, standoff -2.64, extent -12.954,-2.476 12.954,2.477